# Altium footprint library Connect.PcbLib: 272 footprints (part 9 of 17)
Each footprint in its own frame and in the unit in brackets; x right, y up, seen from the top. Pads: shape width x height; smd on the part's side, far side on the other; paste and mask are expansions set on the pad; w line width, h text height; cw(c..) or ccw(c..) is an arc to the next point about the centre after c.
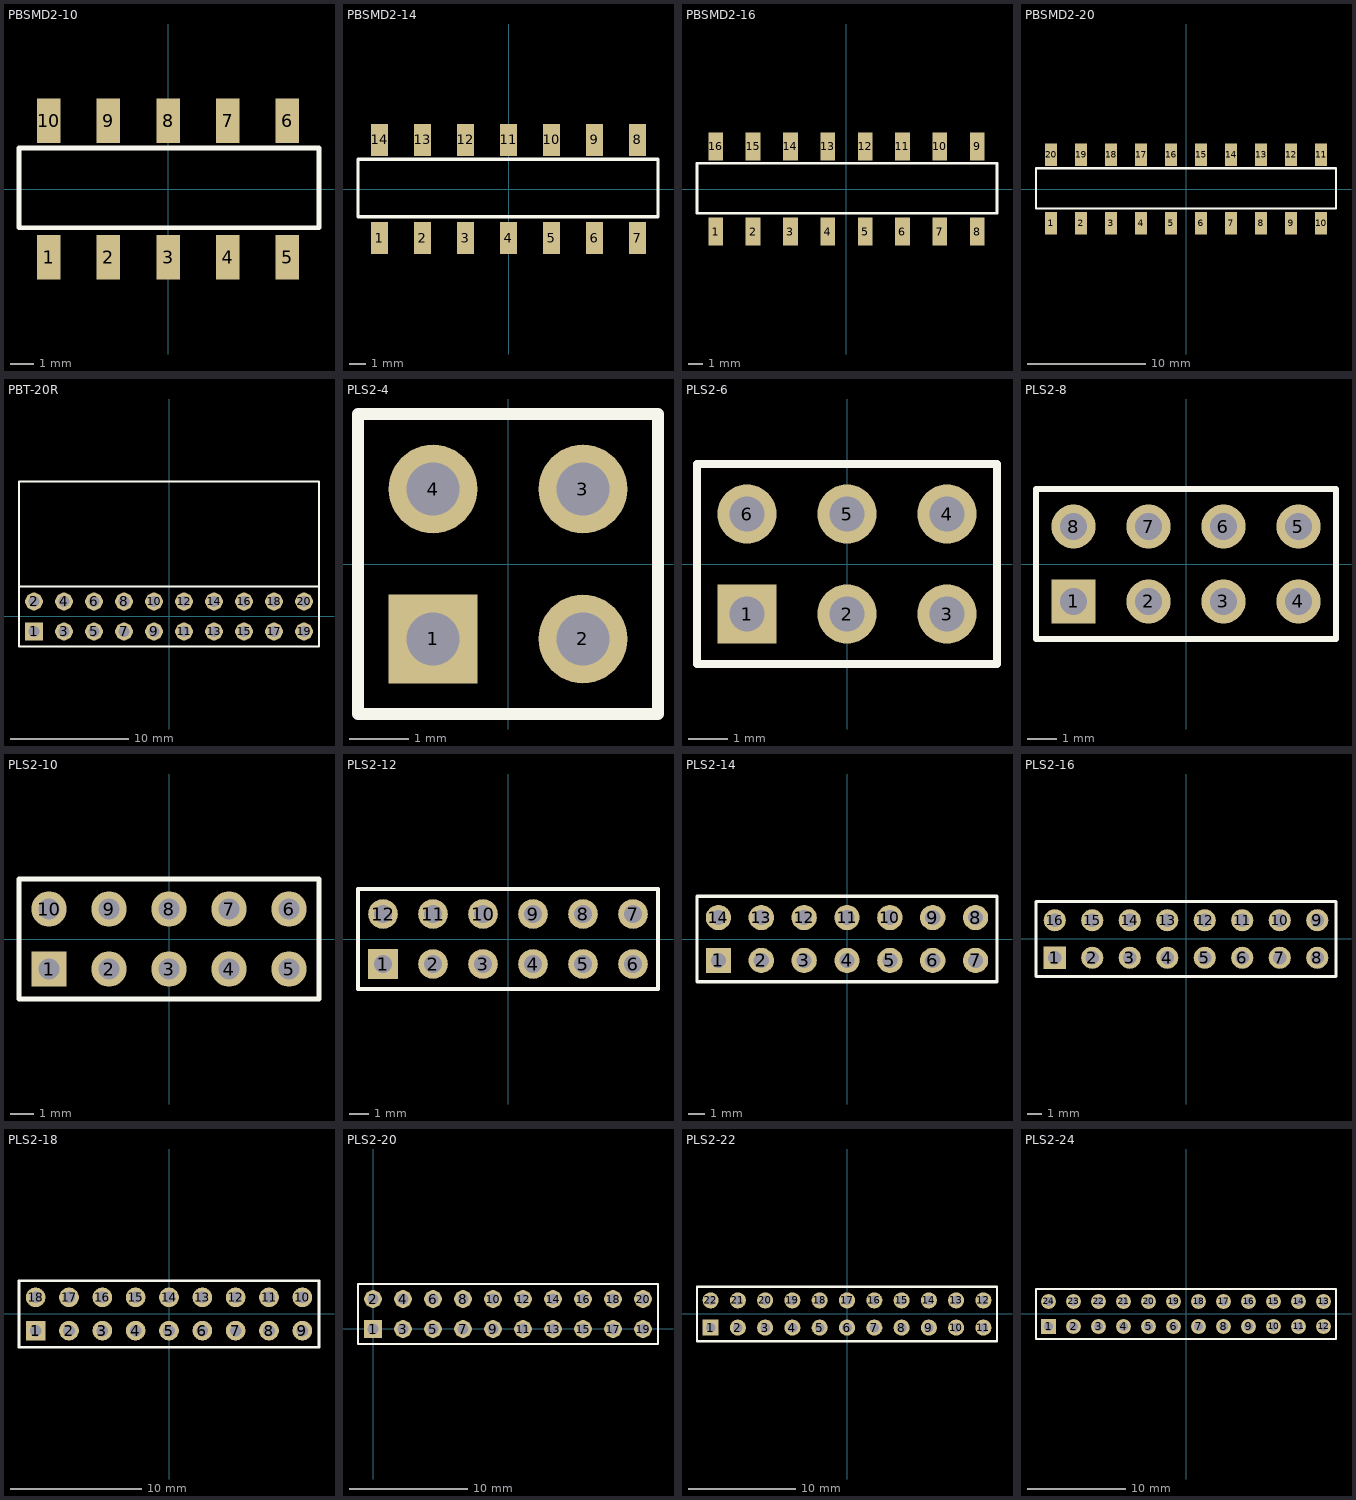
[diagram p8: the footprints below, top view; thin cyan lines are the x and y axes]

## PBSMD2-10 [mm] "Connector; Header; 10 Position"
height 7.1
pads (10):
  rect 1x1.9 smd: 1(-5.08,-2.9) 2(-2.54,-2.9) 3(0,-2.9) 4(2.54,-2.9) 5(5.08,-2.9) 6(5.08,2.9) 7(2.54,2.9) 8(0,2.9) 9(-2.54,2.9) 10(-5.08,2.9)
Top Overlay:
  lines w0.2: -6.35,-1.65 6.425,-1.65 6.425,1.75 -6.35,1.75 -6.35,-1.65
3D body: height 7.1, standoff 0, extent -6.35,-1.65 6.425,1.75

## PBSMD2-14 [mm] "Connector; Header; 14 Position"
height 7.1
pads (14):
  rect 1x1.9 smd: 1(-7.62,-2.9) 2(-5.08,-2.9) 3(-2.54,-2.9) 4(0,-2.9) 5(2.54,-2.9) 6(5.08,-2.9) 7(7.62,-2.9) 8(7.62,2.9) 9(5.08,2.9) 10(2.54,2.9) 11(0,2.9) 12(-2.54,2.9) 13(-5.08,2.9) 14(-7.62,2.9)
Top Overlay:
  lines w0.2: -8.89,-1.65 -8.89,1.75 8.83,1.75 8.83,-1.65 -8.89,-1.65
3D body: height 7.1, standoff 0, extent -8.89,-1.65 8.805,1.75

## PBSMD2-16 [mm] "Connector; Header; 16 Position"
height 7.1
pads (16):
  rect 1x1.9 smd: 1(-8.89,-2.9) 2(-6.35,-2.9) 3(-3.81,-2.9) 4(-1.27,-2.9) 5(1.27,-2.9) 6(3.81,-2.9) 7(6.35,-2.9) 8(8.89,-2.9) 9(8.89,2.9) 10(6.35,2.9) 11(3.81,2.9) 12(1.27,2.9) 13(-1.27,2.9) 14(-3.81,2.9) 15(-6.35,2.9) 16(-8.89,2.9)
Top Overlay:
  lines w0.2: -10.16,-1.65 10.235,-1.65 10.235,1.75 -10.16,1.75 -10.16,-1.65
3D body: height 7.1, standoff 0, extent -10.16,-1.65 10.26,1.75

## PBSMD2-20 [mm] "Connector; Header; 20 Position"
height 7.5
pads (20):
  rect 1x1.9 smd: 1(-11.43,-2.9) 2(-8.89,-2.9) 3(-6.35,-2.9) 4(-3.81,-2.9) 5(-1.27,-2.9) 6(1.27,-2.9) 7(3.81,-2.9) 8(6.35,-2.9) 9(8.89,-2.9) 10(11.43,-2.9) 11(11.43,2.9) 12(8.89,2.9) 13(6.35,2.9) 14(3.81,2.9) 15(1.27,2.9) 16(-1.27,2.9) 17(-3.81,2.9) 18(-6.35,2.9) 19(-8.89,2.9) 20(-11.43,2.9)
Top Overlay:
  lines w0.2: -12.7,-1.65 -12.7,1.75 12.7,1.75 12.7,-1.65 -12.7,-1.65
3D body: height 7.1, standoff 0, extent -12.7,-1.65 12.7,1.75

## PBT-20R [mm]
height 5
pads (20):
  rect 1.5x1.5 hole 0.9: 1(-11.43,-1.27)
  round 1.5 hole 0.9: 2(-11.43,1.27) 3(-8.89,-1.27) 4(-8.89,1.27) 5(-6.35,-1.27) 6(-6.35,1.27) 7(-3.81,-1.27) 8(-3.81,1.27) 9(-1.27,-1.27) 10(-1.27,1.27) 11(1.27,-1.27) 12(1.27,1.27) 13(3.81,-1.27) 14(3.81,1.27) 15(6.35,-1.27) 16(6.35,1.27) 17(8.89,-1.27) 18(8.89,1.27) 19(11.43,-1.27) 20(11.43,1.27)
Top Overlay:
  lines w0.2: 12.67,2.54 -12.7,2.54 ; -12.7,2.54 -12.7,-2.54 12.7,-2.54 12.7,2.54 12.7,11.425 -12.7,11.425 -12.7,2.54
3D body "PBT-20R.stp": height 5.08, standoff -3, extent -12.7,-1.58 12.7,11.32

## PLS2-4 [mm] "Connector; Header; 4 Position"
height 7.5
pads (4):
  rect 1.5x1.5 hole 0.9: 1(-1.27,-1.27)
  round 1.5 hole 0.9: 2(1.27,-1.27) 3(1.27,1.27) 4(-1.27,1.27)
Top Overlay:
  lines w0.2: -2.54,2.53 -2.54,-2.54 2.54,-2.54 2.54,2.53 ; -2.54,2.54 2.54,2.54
3D body "PLS-1.step": height 8.44, standoff -3, extent 0,0 2.54,2.54
3D body "PLS-1.step": height 8.44, standoff -3, extent -2.54,0 0,2.54
3D body "PLS-1.step": height 8.44, standoff -3, extent 0,-2.54 2.54,0
3D body "PLS-1.step": height 8.44, standoff -3, extent -2.54,-2.54 0,0

## PLS2-6 [mm] "Connector; Header; 6 Position"
height 7.5
pads (6):
  rect 1.5x1.5 hole 0.9: 1(-2.54,-1.27)
  round 1.5 hole 0.9: 2(0,-1.27) 3(2.54,-1.27) 4(2.54,1.27) 5(0,1.27) 6(-2.54,1.27)
Top Overlay:
  lines w0.2: -3.81,2.53 -3.81,-2.54 3.81,-2.54 3.81,2.53 ; -3.81,2.54 3.81,2.54
3D body "PLS-1.step": height 8.44, standoff -3, extent 1.27,-2.54 3.81,0
3D body "PLS-1.step": height 8.44, standoff -3, extent 1.27,0 3.81,2.54
3D body "PLS-1.step": height 8.44, standoff -3, extent -1.27,0 1.27,2.54
3D body "PLS-1.step": height 8.44, standoff -3, extent -3.81,0 -1.27,2.54
3D body "PLS-1.step": height 8.44, standoff -3, extent -1.27,-2.54 1.27,0
3D body "PLS-1.step": height 8.44, standoff -3, extent -3.81,-2.54 -1.27,0

## PLS2-8 [mm] "Connector; Header; 8 Position"
height 7.5
pads (8):
  rect 1.5x1.5 hole 0.9: 1(-3.81,-1.27)
  round 1.5 hole 0.9: 2(-1.27,-1.27) 3(1.27,-1.27) 4(3.81,-1.27) 5(3.81,1.27) 6(1.27,1.27) 7(-1.27,1.27) 8(-3.81,1.27)
Top Overlay:
  lines w0.2: -5.08,2.53 -5.08,-2.54 5.08,-2.54 5.08,2.53 ; -5.08,2.54 5.08,2.54
3D body "PLS-1.step": height 8.44, standoff -3, extent 2.54,-2.54 5.08,0
3D body "PLS-1.step": height 8.44, standoff -3, extent 2.54,0 5.08,2.54
3D body "PLS-1.step": height 8.44, standoff -3, extent -5.08,-2.54 -2.54,0
3D body "PLS-1.step": height 8.44, standoff -3, extent -2.54,-2.54 0,0
3D body "PLS-1.step": height 8.44, standoff -3, extent -5.08,0 -2.54,2.54
3D body "PLS-1.step": height 8.44, standoff -3, extent -2.54,0 0,2.54
3D body "PLS-1.step": height 8.44, standoff -3, extent 0,0 2.54,2.54
3D body "PLS-1.step": height 8.44, standoff -3, extent 0,-2.54 2.54,0

## PLS2-10 [mm] "Connector; Header; 10 Position"
height 7.5
pads (10):
  rect 1.5x1.5 hole 0.9: 1(-5.08,-1.27)
  round 1.5 hole 0.9: 2(-2.54,-1.27) 3(0,-1.27) 4(2.54,-1.27) 5(5.08,-1.27) 6(5.08,1.27) 7(2.54,1.27) 8(0,1.27) 9(-2.54,1.27) 10(-5.08,1.27)
Top Overlay:
  lines w0.2: -6.35,2.53 -6.35,-2.54 6.35,-2.54 6.35,2.53 ; -6.35,2.54 6.35,2.54
3D body "PLS-1.step": height 8.44, standoff -3, extent 1.27,-2.54 3.81,0
3D body "PLS-1.step": height 8.44, standoff -3, extent 1.27,0 3.81,2.54
3D body "PLS-1.step": height 8.44, standoff -3, extent -6.35,-2.54 -3.81,0
3D body "PLS-1.step": height 8.44, standoff -3, extent -3.81,-2.54 -1.27,0
3D body "PLS-1.step": height 8.44, standoff -3, extent -6.35,0 -3.81,2.54
3D body "PLS-1.step": height 8.44, standoff -3, extent -3.81,0 -1.27,2.54
3D body "PLS-1.step": height 8.44, standoff -3, extent -1.27,0 1.27,2.54
3D body "PLS-1.step": height 8.44, standoff -3, extent -1.27,-2.54 1.27,0
3D body "PLS-1.step": height 8.44, standoff -3, extent 3.81,0 6.35,2.54
3D body "PLS-1.step": height 8.44, standoff -3, extent 3.81,-2.54 6.35,0

## PLS2-12 [mm] "Connector; Header; 12 Position"
height 7.5
pads (12):
  rect 1.5x1.5 hole 0.9: 1(-6.35,-1.27)
  round 1.5 hole 0.9: 2(-3.81,-1.27) 3(-1.27,-1.27) 4(1.27,-1.27) 5(3.81,-1.27) 6(6.35,-1.27) 7(6.35,1.27) 8(3.81,1.27) 9(1.27,1.27) 10(-1.27,1.27) 11(-3.81,1.27) 12(-6.35,1.27)
Top Overlay:
  lines w0.2: -7.62,2.53 -7.62,-2.54 7.62,-2.54 7.62,2.53 ; -7.62,2.54 7.62,2.54
3D body "PLS-1.step": height 8.44, standoff -3, extent 5.08,-2.54 7.62,0
3D body "PLS-1.step": height 8.44, standoff -3, extent 5.08,0 7.62,2.54
3D body "PLS-1.step": height 8.44, standoff -3, extent 0,-2.54 2.54,0
3D body "PLS-1.step": height 8.44, standoff -3, extent 0,0 2.54,2.54
3D body "PLS-1.step": height 8.44, standoff -3, extent -7.62,-2.54 -5.08,0
3D body "PLS-1.step": height 8.44, standoff -3, extent -5.08,-2.54 -2.54,0
3D body "PLS-1.step": height 8.44, standoff -3, extent -7.62,0 -5.08,2.54
3D body "PLS-1.step": height 8.44, standoff -3, extent -5.08,0 -2.54,2.54
3D body "PLS-1.step": height 8.44, standoff -3, extent -2.54,0 0,2.54
3D body "PLS-1.step": height 8.44, standoff -3, extent -2.54,-2.54 0,0
3D body "PLS-1.step": height 8.44, standoff -3, extent 2.54,0 5.08,2.54
3D body "PLS-1.step": height 8.44, standoff -3, extent 2.54,-2.54 5.08,0

## PLS2-14 [mm] "Connector; Header; 14 Position"
height 7.5
pads (14):
  rect 1.5x1.5 hole 0.9: 1(-7.62,-1.27)
  round 1.5 hole 0.9: 2(-5.08,-1.27) 3(-2.54,-1.27) 4(0,-1.27) 5(2.54,-1.27) 6(5.08,-1.27) 7(7.62,-1.27) 8(7.62,1.27) 9(5.08,1.27) 10(2.54,1.27) 11(0,1.27) 12(-2.54,1.27) 13(-5.08,1.27) 14(-7.62,1.27)
Top Overlay:
  lines w0.2: -8.89,2.53 -8.89,-2.54 8.89,-2.54 8.89,2.53 ; -8.89,2.54 8.89,2.54
3D body "PLS-1.step": height 8.44, standoff -3, extent 6.35,-2.54 8.89,0
3D body "PLS-1.step": height 8.44, standoff -3, extent 6.35,0 8.89,2.54
3D body "PLS-1.step": height 8.44, standoff -3, extent 1.27,-2.54 3.81,0
3D body "PLS-1.step": height 8.44, standoff -3, extent 1.27,0 3.81,2.54
3D body "PLS-1.step": height 8.44, standoff -3, extent -3.81,-2.54 -1.27,0
3D body "PLS-1.step": height 8.44, standoff -3, extent -3.81,0 -1.27,2.54
3D body "PLS-1.step": height 8.44, standoff -3, extent -6.35,0 -3.81,2.54
3D body "PLS-1.step": height 8.44, standoff -3, extent -8.89,0 -6.35,2.54
3D body "PLS-1.step": height 8.44, standoff -3, extent -6.35,-2.54 -3.81,0
3D body "PLS-1.step": height 8.44, standoff -3, extent -8.89,-2.54 -6.35,0
3D body "PLS-1.step": height 8.44, standoff -3, extent -1.27,0 1.27,2.54
3D body "PLS-1.step": height 8.44, standoff -3, extent -1.27,-2.54 1.27,0
3D body "PLS-1.step": height 8.44, standoff -3, extent 3.81,0 6.35,2.54
3D body "PLS-1.step": height 8.44, standoff -3, extent 3.81,-2.54 6.35,0

## PLS2-16 [mm] "Connector; Header; 16 Position"
height 7.5
pads (16):
  rect 1.5x1.5 hole 0.9: 1(-8.89,-1.27)
  round 1.5 hole 0.9: 2(-6.35,-1.27) 3(-3.81,-1.27) 4(-1.27,-1.27) 5(1.27,-1.27) 6(3.81,-1.27) 7(6.35,-1.27) 8(8.89,-1.27) 9(8.89,1.27) 10(6.35,1.27) 11(3.81,1.27) 12(1.27,1.27) 13(-1.27,1.27) 14(-3.81,1.27) 15(-6.35,1.27) 16(-8.89,1.27)
Top Overlay:
  lines w0.2: -10.16,-2.54 -10.16,2.54 10.16,2.54 10.16,-2.54 -10.16,-2.54
3D body "PLS-1.step": height 8.44, standoff -3, extent 5.08,-2.54 7.62,0
3D body "PLS-1.step": height 8.44, standoff -3, extent 5.08,0 7.62,2.54
3D body "PLS-1.step": height 8.44, standoff -3, extent 0,-2.54 2.54,0
3D body "PLS-1.step": height 8.44, standoff -3, extent 0,0 2.54,2.54
3D body "PLS-1.step": height 8.44, standoff -3, extent -5.08,-2.54 -2.54,0
3D body "PLS-1.step": height 8.44, standoff -3, extent -5.08,0 -2.54,2.54
3D body "PLS-1.step": height 8.44, standoff -3, extent -7.62,0 -5.08,2.54
3D body "PLS-1.step": height 8.44, standoff -3, extent -10.16,0 -7.62,2.54
3D body "PLS-1.step": height 8.44, standoff -3, extent -7.62,-2.54 -5.08,0
3D body "PLS-1.step": height 8.44, standoff -3, extent -10.16,-2.54 -7.62,0
3D body "PLS-1.step": height 8.44, standoff -3, extent -2.54,0 0,2.54
3D body "PLS-1.step": height 8.44, standoff -3, extent -2.54,-2.54 0,0
3D body "PLS-1.step": height 8.44, standoff -3, extent 2.54,0 5.08,2.54
3D body "PLS-1.step": height 8.44, standoff -3, extent 2.54,-2.54 5.08,0
3D body "PLS-1.step": height 8.44, standoff -3, extent 7.62,0 10.16,2.54
3D body "PLS-1.step": height 8.44, standoff -3, extent 7.62,-2.54 10.16,0

## PLS2-18 [mm] "Connector; Header; 18 Position"
height 7.5
pads (18):
  rect 1.5x1.5 hole 0.9: 1(-10.16,-1.27)
  round 1.5 hole 0.9: 2(-7.62,-1.27) 3(-5.08,-1.27) 4(-2.54,-1.27) 5(0,-1.27) 6(2.54,-1.27) 7(5.08,-1.27) 8(7.62,-1.27) 9(10.16,-1.27) 10(10.16,1.27) 11(7.62,1.27) 12(5.08,1.27) 13(2.54,1.27) 14(0,1.27) 15(-2.54,1.27) 16(-5.08,1.27) 17(-7.62,1.27) 18(-10.16,1.27)
Top Overlay:
  lines w0.2: -11.43,-2.54 -11.43,2.54 11.43,2.54 11.43,-2.54 -11.43,-2.54
3D body "PLS-1.step": height 8.44, standoff -3, extent 8.89,-2.54 11.43,0
3D body "PLS-1.step": height 8.44, standoff -3, extent 8.89,0 11.43,2.54
3D body "PLS-1.step": height 8.44, standoff -3, extent 3.81,-2.54 6.35,0
3D body "PLS-1.step": height 8.44, standoff -3, extent 3.81,0 6.35,2.54
3D body "PLS-1.step": height 8.44, standoff -3, extent -1.27,-2.54 1.27,0
3D body "PLS-1.step": height 8.44, standoff -3, extent -1.27,0 1.27,2.54
3D body "PLS-1.step": height 8.44, standoff -3, extent -6.35,-2.54 -3.81,0
3D body "PLS-1.step": height 8.44, standoff -3, extent -6.35,0 -3.81,2.54
3D body "PLS-1.step": height 8.44, standoff -3, extent -8.89,0 -6.35,2.54
3D body "PLS-1.step": height 8.44, standoff -3, extent -11.43,0 -8.89,2.54
3D body "PLS-1.step": height 8.44, standoff -3, extent -8.89,-2.54 -6.35,0
3D body "PLS-1.step": height 8.44, standoff -3, extent -11.43,-2.54 -8.89,0
3D body "PLS-1.step": height 8.44, standoff -3, extent -3.81,0 -1.27,2.54
3D body "PLS-1.step": height 8.44, standoff -3, extent -3.81,-2.54 -1.27,0
3D body "PLS-1.step": height 8.44, standoff -3, extent 1.27,0 3.81,2.54
3D body "PLS-1.step": height 8.44, standoff -3, extent 1.27,-2.54 3.81,0
3D body "PLS-1.step": height 8.44, standoff -3, extent 6.35,0 8.89,2.54
3D body "PLS-1.step": height 8.44, standoff -3, extent 6.35,-2.54 8.89,0

## PLS2-20 [mm] "Connector; Header; 20 Position"
height 7.5
pads (20):
  rect 1.5x1.5 hole 0.9: 1(0,0)
  round 1.5 hole 0.9: 2(0,2.54) 3(2.54,0) 4(2.54,2.54) 5(5.08,0) 6(5.08,2.54) 7(7.62,0) 8(7.62,2.54) 9(10.16,0) 10(10.16,2.54) 11(12.7,0) 12(12.7,2.54) 13(15.24,0) 14(15.24,2.54) 15(17.78,0) 16(17.78,2.54) 17(20.32,0) 18(20.32,2.54) 19(22.86,0) 20(22.86,2.54)
Top Overlay:
  lines w0.2: -1.27,-1.27 24.13,-1.27 24.13,3.81 -1.27,3.81 -1.27,-1.27
3D body "PLS-1.step": height 8.44, standoff -3, extent 21.59,-1.27 24.13,1.27
3D body "PLS-1.step": height 8.44, standoff -3, extent 21.59,1.27 24.13,3.81
3D body "PLS-1.step": height 8.44, standoff -3, extent 16.51,-1.27 19.05,1.27
3D body "PLS-1.step": height 8.44, standoff -3, extent 16.51,1.27 19.05,3.81
3D body "PLS-1.step": height 8.44, standoff -3, extent 11.43,-1.27 13.97,1.27
3D body "PLS-1.step": height 8.44, standoff -3, extent 11.43,1.27 13.97,3.81
3D body "PLS-1.step": height 8.44, standoff -3, extent 6.35,-1.27 8.89,1.27
3D body "PLS-1.step": height 8.44, standoff -3, extent 6.35,1.27 8.89,3.81
3D body "PLS-1.step": height 8.44, standoff -3, extent -1.27,-1.27 1.27,1.27
3D body "PLS-1.step": height 8.44, standoff -3, extent 1.27,-1.27 3.81,1.27
3D body "PLS-1.step": height 8.44, standoff -3, extent -1.27,1.27 1.27,3.81
3D body "PLS-1.step": height 8.44, standoff -3, extent 1.27,1.27 3.81,3.81
3D body "PLS-1.step": height 8.44, standoff -3, extent 3.81,1.27 6.35,3.81
3D body "PLS-1.step": height 8.44, standoff -3, extent 3.81,-1.27 6.35,1.27
3D body "PLS-1.step": height 8.44, standoff -3, extent 8.89,1.27 11.43,3.81
3D body "PLS-1.step": height 8.44, standoff -3, extent 8.89,-1.27 11.43,1.27
3D body "PLS-1.step": height 8.44, standoff -3, extent 13.97,1.27 16.51,3.81
3D body "PLS-1.step": height 8.44, standoff -3, extent 13.97,-1.27 16.51,1.27
3D body "PLS-1.step": height 8.44, standoff -3, extent 19.05,1.27 21.59,3.81
3D body "PLS-1.step": height 8.44, standoff -3, extent 19.05,-1.27 21.59,1.27

## PLS2-22 [mm]
pads (22):
  rect 1.5x1.5 hole 0.9: 1(-12.7,-1.27)
  round 1.5 hole 0.9: 2(-10.16,-1.27) 3(-7.62,-1.27) 4(-5.08,-1.27) 5(-2.54,-1.27) 6(0,-1.27) 7(2.54,-1.27) 8(5.08,-1.27) 9(7.62,-1.27) 10(10.16,-1.27) 11(12.7,-1.27) 12(12.7,1.27) 13(10.16,1.27) 14(7.62,1.27) 15(5.08,1.27) 16(2.54,1.27) 17(0,1.27) 18(-2.54,1.27) 19(-5.08,1.27) 20(-7.62,1.27) 21(-10.16,1.27) 22(-12.7,1.27)
Top Overlay:
  lines w0.2: -13.97,-2.54 13.97,-2.54 13.97,2.54 -13.97,2.54 -13.97,-2.54

## PLS2-24 [mm]
pads (24):
  rect 1.5x1.5 hole 0.9: 1(-13.97,-1.27)
  round 1.5 hole 0.9: 2(-11.43,-1.27) 3(-8.89,-1.27) 4(-6.35,-1.27) 5(-3.81,-1.27) 6(-1.27,-1.27) 7(1.27,-1.27) 8(3.81,-1.27) 9(6.35,-1.27) 10(8.89,-1.27) 11(11.43,-1.27) 12(13.97,-1.27) 13(13.97,1.27) 14(11.43,1.27) 15(8.89,1.27) 16(6.35,1.27) 17(3.81,1.27) 18(1.27,1.27) 19(-1.27,1.27) 20(-3.81,1.27) 21(-6.35,1.27) 22(-8.89,1.27) 23(-11.43,1.27) 24(-13.97,1.27)
Top Overlay:
  lines w0.2: 15.23,-2.54 -15.24,-2.54 -15.24,2.54 15.23,2.54 ; 15.24,-2.54 15.24,2.54